# Altium schematic symbol library jlcpcb_2025_04_capacitors_extended_1206.schlib: 2503 symbols (part 5 of 14) (continued)
## C1206X222K201T
designator C?  Capacitance: 2.2nF  (hidden comment: *)
Capacitor, Ceramic (MLCC), 2.2nF, ±10%, 200V, X7R, ±10%, SMD 1206; Manufacturer: IHHEC(HOLY STONE ENTERPRISE CO., LTD); Manufacturer Part Number: C1206X222K201T; Package Size: 1206; JLCPCB Basic Part: No; JLCPCB Part Number: C106039; Supplier 1: LCSC; Category: Capacitors - MLCC; Supplier Part Number 1: C106039; Tolerance: ±10%; Voltage Rating: 200V; Temperature Coefficient: X7R; RoHS: Yes; ComponentLink1Description: Datasheet; ComponentLink1URL: https://wmsc.lcsc.com/wmsc/upload/file/pdf/v2/lcsc/2304140030_IHHEC-HOLY-STONE-ENTERPRISE-CO---LTD-C1206X222K201T_C106039.pdf; ComponentLink2Description: JLCPCB Part URL; ComponentLink2URL: https://jlcpcb.com/partdetail/C106039; ComponentLink3Description: LCSC Part URL; ComponentLink3URL: https://lcsc.com/product-detail/Multilayer-Ceramic-Capacitors-MLCC---SMD-SMT_IHHECHOLY-STONE-ENTERPRISE-CO.%2C-LTD-IHHECHOLY-STONE-ENTERPRISE-CO.%2C-LTD-C1206X222K201T_C106039.html
footprint CAP-1206 (1206 (3216M) Capacitor)
pins: 1, 2

## C1206X222K202T
designator C?  Capacitance: 2.2nF  (hidden comment: *)
Capacitor, Ceramic (MLCC), 2.2nF, ±10%, 2kV, X7R, ±10%, SMD 1206; Manufacturer: IHHEC(HOLY STONE ENTERPRISE CO., LTD); Manufacturer Part Number: C1206X222K202T; Package Size: 1206; JLCPCB Basic Part: No; JLCPCB Part Number: C106040; Supplier 1: LCSC; Category: Capacitors - MLCC; Supplier Part Number 1: C106040; Tolerance: ±10%; Voltage Rating: 2kV; Temperature Coefficient: X7R; RoHS: Yes; ComponentLink1Description: Datasheet; ComponentLink1URL: https://wmsc.lcsc.com/wmsc/upload/file/pdf/v2/lcsc/2304140030_IHHEC-HOLY-STONE-ENTERPRISE-CO---LTD-C1206X222K202T_C106040.pdf; ComponentLink2Description: JLCPCB Part URL; ComponentLink2URL: https://jlcpcb.com/partdetail/C106040; ComponentLink3Description: LCSC Part URL; ComponentLink3URL: https://lcsc.com/product-detail/Multilayer-Ceramic-Capacitors-MLCC---SMD-SMT_IHHECHOLY-STONE-ENTERPRISE-CO.%2C-LTD-IHHECHOLY-STONE-ENTERPRISE-CO.%2C-LTD-C1206X222K202T_C106040.html
footprint CAP-1206 (1206 (3216M) Capacitor)
pins: 1, 2

## C1206X222K251T
designator C?  Capacitance: 2.2nF  (hidden comment: *)
Capacitor, Ceramic (MLCC), 2.2nF, ±10%, 250V, X7R, ±10%, SMD 1206; Manufacturer: IHHEC(HOLY STONE ENTERPRISE CO., LTD); Manufacturer Part Number: C1206X222K251T; Package Size: 1206; JLCPCB Basic Part: No; JLCPCB Part Number: C106041; Supplier 1: LCSC; Category: Capacitors - MLCC; Supplier Part Number 1: C106041; Tolerance: ±10%; Voltage Rating: 250V; Temperature Coefficient: X7R; RoHS: Yes; ComponentLink1Description: Datasheet; ComponentLink1URL: https://wmsc.lcsc.com/wmsc/upload/file/pdf/v2/lcsc/2304140030_IHHEC-HOLY-STONE-ENTERPRISE-CO---LTD-C1206X222K251T_C106041.pdf; ComponentLink2Description: JLCPCB Part URL; ComponentLink2URL: https://jlcpcb.com/partdetail/C106041; ComponentLink3Description: LCSC Part URL; ComponentLink3URL: https://lcsc.com/product-detail/Multilayer-Ceramic-Capacitors-MLCC---SMD-SMT_IHHECHOLY-STONE-ENTERPRISE-CO.%2C-LTD-IHHECHOLY-STONE-ENTERPRISE-CO.%2C-LTD-C1206X222K251T_C106041.html
footprint CAP-1206 (1206 (3216M) Capacitor)
pins: 1, 2

## C1206X222K501T
designator C?  Capacitance: 2.2nF  (hidden comment: *)
Capacitor, Ceramic (MLCC), 2.2nF, ±10%, 500V, X7R, ±10%, SMD 1206; Manufacturer: IHHEC(HOLY STONE ENTERPRISE CO., LTD); Manufacturer Part Number: C1206X222K501T; Package Size: 1206; JLCPCB Basic Part: No; JLCPCB Part Number: C106042; Supplier 1: LCSC; Category: Capacitors - MLCC; Supplier Part Number 1: C106042; Tolerance: ±10%; Voltage Rating: 500V; Temperature Coefficient: X7R; RoHS: Yes; ComponentLink1Description: Datasheet; ComponentLink1URL: https://wmsc.lcsc.com/wmsc/upload/file/pdf/v2/lcsc/2304140030_IHHEC-HOLY-STONE-ENTERPRISE-CO---LTD-C1206X222K501T_C106042.pdf; ComponentLink2Description: JLCPCB Part URL; ComponentLink2URL: https://jlcpcb.com/partdetail/C106042; ComponentLink3Description: LCSC Part URL; ComponentLink3URL: https://lcsc.com/product-detail/Multilayer-Ceramic-Capacitors-MLCC---SMD-SMT_IHHECHOLY-STONE-ENTERPRISE-CO.%2C-LTD-IHHECHOLY-STONE-ENTERPRISE-CO.%2C-LTD-C1206X222K501T_C106042.html
footprint CAP-1206 (1206 (3216M) Capacitor)
pins: 1, 2

## C1206X223K101T
designator C?  Capacitance: 22nF  (hidden comment: *)
Capacitor, Ceramic (MLCC), 22nF, ±10%, 100V, X7R, ±10%, SMD 1206; Manufacturer: IHHEC(HOLY STONE ENTERPRISE CO., LTD); Manufacturer Part Number: C1206X223K101T; Package Size: 1206; JLCPCB Basic Part: No; JLCPCB Part Number: C106043; Supplier 1: LCSC; Category: Capacitors - MLCC; Supplier Part Number 1: C106043; Tolerance: ±10%; Voltage Rating: 100V; Temperature Coefficient: X7R; RoHS: Yes; ComponentLink1Description: Datasheet; ComponentLink1URL: https://wmsc.lcsc.com/wmsc/upload/file/pdf/v2/lcsc/2304140030_IHHEC-HOLY-STONE-ENTERPRISE-CO---LTD-C1206X223K101T_C106043.pdf; ComponentLink2Description: JLCPCB Part URL; ComponentLink2URL: https://jlcpcb.com/partdetail/C106043; ComponentLink3Description: LCSC Part URL; ComponentLink3URL: https://lcsc.com/product-detail/Multilayer-Ceramic-Capacitors-MLCC---SMD-SMT_IHHECHOLY-STONE-ENTERPRISE-CO.%2C-LTD-IHHECHOLY-STONE-ENTERPRISE-CO.%2C-LTD-C1206X223K101T_C106043.html
footprint CAP-1206 (1206 (3216M) Capacitor)
pins: 1, 2

## C1206X223K251T
designator C?  Capacitance: 22nF  (hidden comment: *)
Capacitor, Ceramic (MLCC), 22nF, ±10%, 250V, X7R, ±10%, SMD 1206; Manufacturer: IHHEC(HOLY STONE ENTERPRISE CO., LTD); Manufacturer Part Number: C1206X223K251T; Package Size: 1206; JLCPCB Basic Part: No; JLCPCB Part Number: C106044; Supplier 1: LCSC; Category: Capacitors - MLCC; Supplier Part Number 1: C106044; Tolerance: ±10%; Voltage Rating: 250V; Temperature Coefficient: X7R; RoHS: Yes; ComponentLink1Description: Datasheet; ComponentLink1URL: https://wmsc.lcsc.com/wmsc/upload/file/pdf/v2/lcsc/2304140030_IHHEC-HOLY-STONE-ENTERPRISE-CO---LTD-C1206X223K251T_C106044.pdf; ComponentLink2Description: JLCPCB Part URL; ComponentLink2URL: https://jlcpcb.com/partdetail/C106044; ComponentLink3Description: LCSC Part URL; ComponentLink3URL: https://lcsc.com/product-detail/Multilayer-Ceramic-Capacitors-MLCC---SMD-SMT_IHHECHOLY-STONE-ENTERPRISE-CO.%2C-LTD-IHHECHOLY-STONE-ENTERPRISE-CO.%2C-LTD-C1206X223K251T_C106044.html
footprint CAP-1206 (1206 (3216M) Capacitor)
pins: 1, 2

## C1206X224K201T_C106048
designator C?  Capacitance: 220nF  (hidden comment: *)
Capacitor, Ceramic (MLCC), 220nF, ±10%, 200V, X7R, ±10%, SMD 1206; Manufacturer: IHHEC(HOLY STONE ENTERPRISE CO., LTD); Manufacturer Part Number: C1206X224K201T; Package Size: 1206; JLCPCB Basic Part: No; JLCPCB Part Number: C106048; Supplier 1: LCSC; Category: Capacitors - MLCC; Supplier Part Number 1: C106048; Tolerance: ±10%; Voltage Rating: 200V; Temperature Coefficient: X7R; RoHS: Yes; ComponentLink1Description: Datasheet; ComponentLink1URL: https://wmsc.lcsc.com/wmsc/upload/file/pdf/v2/lcsc/2304140030_IHHEC-HOLY-STONE-ENTERPRISE-CO---LTD-C1206X224K201T_C106048.pdf; ComponentLink2Description: JLCPCB Part URL; ComponentLink2URL: https://jlcpcb.com/partdetail/C106048; ComponentLink3Description: LCSC Part URL; ComponentLink3URL: https://lcsc.com/product-detail/Multilayer-Ceramic-Capacitors-MLCC---SMD-SMT_IHHECHOLY-STONE-ENTERPRISE-CO.%2C-LTD-IHHECHOLY-STONE-ENTERPRISE-CO.%2C-LTD-C1206X224K201T_C106048.html
footprint CAP-1206 (1206 (3216M) Capacitor)
pins: 1, 2

## C1206X224K201T_C330057
designator C?  Capacitance: 220nF  (hidden comment: *)
Capacitor, Ceramic (MLCC), 220nF, ±10%, 200V, X7R, ±10%, SMD 1206; Manufacturer: IHHEC(HOLY STONE ENTERPRISE CO., LTD); Manufacturer Part Number: C1206X224K201T; Package Size: 1206; JLCPCB Basic Part: No; JLCPCB Part Number: C330057; Supplier 1: LCSC; Category: Capacitors - MLCC; Supplier Part Number 1: C330057; Tolerance: ±10%; Voltage Rating: 200V; Temperature Coefficient: X7R; RoHS: Yes; ComponentLink1Description: Datasheet; ComponentLink1URL: https://wmsc.lcsc.com/wmsc/upload/file/pdf/v2/lcsc/2304140030_IHHEC-HOLY-STONE-ENTERPRISE-CO---LTD-C1206X224K201T_C330057.pdf; ComponentLink2Description: JLCPCB Part URL; ComponentLink2URL: https://jlcpcb.com/partdetail/C330057; ComponentLink3Description: LCSC Part URL; ComponentLink3URL: https://lcsc.com/product-detail/Multilayer-Ceramic-Capacitors-MLCC---SMD-SMT_IHHECHOLY-STONE-ENTERPRISE-CO.%2C-LTD-IHHECHOLY-STONE-ENTERPRISE-CO.%2C-LTD-C1206X224K201T_C330057.html
footprint CAP-1206 (1206 (3216M) Capacitor)
pins: 1, 2

## C1206X224K251T
designator C?  Capacitance: 220nF  (hidden comment: *)
Capacitor, Ceramic (MLCC), 220nF, ±10%, 250V, X7R, ±10%, SMD 1206; Manufacturer: IHHEC(HOLY STONE ENTERPRISE CO., LTD); Manufacturer Part Number: C1206X224K251T; Package Size: 1206; JLCPCB Basic Part: No; JLCPCB Part Number: C106049; Supplier 1: LCSC; Category: Capacitors - MLCC; Supplier Part Number 1: C106049; Tolerance: ±10%; Voltage Rating: 250V; Temperature Coefficient: X7R; RoHS: Yes; ComponentLink1Description: Datasheet; ComponentLink1URL: https://wmsc.lcsc.com/wmsc/upload/file/pdf/v2/lcsc/2304140030_IHHEC-HOLY-STONE-ENTERPRISE-CO---LTD-C1206X224K251T_C106049.pdf; ComponentLink2Description: JLCPCB Part URL; ComponentLink2URL: https://jlcpcb.com/partdetail/C106049; ComponentLink3Description: LCSC Part URL; ComponentLink3URL: https://lcsc.com/product-detail/Multilayer-Ceramic-Capacitors-MLCC---SMD-SMT_IHHECHOLY-STONE-ENTERPRISE-CO.%2C-LTD-IHHECHOLY-STONE-ENTERPRISE-CO.%2C-LTD-C1206X224K251T_C106049.html
footprint CAP-1206 (1206 (3216M) Capacitor)
pins: 1, 2

## C1206X225K101T
designator C?  Capacitance: 2.2uF  (hidden comment: *)
Capacitor, Ceramic (MLCC), 2.2uF, ±10%, 100V, X7R, ±10%, SMD 1206; Manufacturer: IHHEC(HOLY STONE ENTERPRISE CO., LTD); Manufacturer Part Number: C1206X225K101T; Package Size: 1206; JLCPCB Basic Part: No; JLCPCB Part Number: C106051; Supplier 1: LCSC; Category: Capacitors - MLCC; Supplier Part Number 1: C106051; Tolerance: ±10%; Voltage Rating: 100V; Temperature Coefficient: X7R; RoHS: Yes; ComponentLink1Description: Datasheet; ComponentLink1URL: https://wmsc.lcsc.com/wmsc/upload/file/pdf/v2/lcsc/2304140030_IHHEC-HOLY-STONE-ENTERPRISE-CO---LTD-C1206X225K101T_C106051.pdf; ComponentLink2Description: JLCPCB Part URL; ComponentLink2URL: https://jlcpcb.com/partdetail/C106051; ComponentLink3Description: LCSC Part URL; ComponentLink3URL: https://lcsc.com/product-detail/Multilayer-Ceramic-Capacitors-MLCC---SMD-SMT_IHHECHOLY-STONE-ENTERPRISE-CO.%2C-LTD-IHHECHOLY-STONE-ENTERPRISE-CO.%2C-LTD-C1206X225K101T_C106051.html
footprint CAP-1206 (1206 (3216M) Capacitor)
pins: 1, 2

## C1206X225K101TE30
designator C?  Capacitance: 2.2uF  (hidden comment: *)
Capacitor, Ceramic (MLCC), 2.2uF, ±10%, 100V, X7R, ±10%, SMD 1206; Manufacturer: IHHEC(HOLY STONE ENTERPRISE CO., LTD); Manufacturer Part Number: C1206X225K101TE30; Package Size: 1206; JLCPCB Basic Part: No; JLCPCB Part Number: C2922468; Supplier 1: LCSC; Category: Capacitors - MLCC; Supplier Part Number 1: C2922468; Tolerance: ±10%; Voltage Rating: 100V; Temperature Coefficient: X7R; RoHS: Yes; ComponentLink1Description: Datasheet; ComponentLink1URL: https://wmsc.lcsc.com/wmsc/upload/file/pdf/v2/lcsc/2111301030_IHHEC-HOLY-STONE-ENTERPRISE-CO---LTD-C1206X225K101TE30_C2922468.pdf; ComponentLink2Description: JLCPCB Part URL; ComponentLink2URL: https://jlcpcb.com/partdetail/C2922468; ComponentLink3Description: LCSC Part URL; ComponentLink3URL: https://lcsc.com/product-detail/Multilayer-Ceramic-Capacitors-MLCC---SMD-SMT_IHHECHOLY-STONE-ENTERPRISE-CO.%2C-LTD-IHHECHOLY-STONE-ENTERPRISE-CO.%2C-LTD-C1206X225K101TE30_C2922468.html
footprint CAP-1206 (1206 (3216M) Capacitor)
pins: 1, 2

## C1206X273K501T
designator C?  Capacitance: 27nF  (hidden comment: *)
Capacitor, Ceramic (MLCC), 27nF, ±10%, 500V, X7R, ±10%, SMD 1206; Manufacturer: IHHEC(HOLY STONE ENTERPRISE CO., LTD); Manufacturer Part Number: C1206X273K501T; Package Size: 1206; JLCPCB Basic Part: No; JLCPCB Part Number: C106053; Supplier 1: LCSC; Category: Capacitors - MLCC; Supplier Part Number 1: C106053; Tolerance: ±10%; Voltage Rating: 500V; Temperature Coefficient: X7R; RoHS: Yes; ComponentLink1Description: Datasheet; ComponentLink1URL: https://wmsc.lcsc.com/wmsc/upload/file/pdf/v2/lcsc/2304140030_IHHEC-HOLY-STONE-ENTERPRISE-CO---LTD-C1206X273K501T_C106053.pdf; ComponentLink2Description: JLCPCB Part URL; ComponentLink2URL: https://jlcpcb.com/partdetail/C106053; ComponentLink3Description: LCSC Part URL; ComponentLink3URL: https://lcsc.com/product-detail/Multilayer-Ceramic-Capacitors-MLCC---SMD-SMT_IHHECHOLY-STONE-ENTERPRISE-CO.%2C-LTD-IHHECHOLY-STONE-ENTERPRISE-CO.%2C-LTD-C1206X273K501T_C106053.html
footprint CAP-1206 (1206 (3216M) Capacitor)
pins: 1, 2

## C1206X273K631T
designator C?  Capacitance: 27nF  (hidden comment: *)
Capacitor, Ceramic (MLCC), 27nF, ±10%, 630V, X7R, ±10%, SMD 1206; Manufacturer: IHHEC(HOLY STONE ENTERPRISE CO., LTD); Manufacturer Part Number: C1206X273K631T; Package Size: 1206; JLCPCB Basic Part: No; JLCPCB Part Number: C106054; Supplier 1: LCSC; Category: Capacitors - MLCC; Supplier Part Number 1: C106054; Tolerance: ±10%; Voltage Rating: 630V; Temperature Coefficient: X7R; RoHS: Yes; ComponentLink1Description: Datasheet; ComponentLink1URL: https://wmsc.lcsc.com/wmsc/upload/file/pdf/v2/lcsc/2304140030_IHHEC-HOLY-STONE-ENTERPRISE-CO---LTD-C1206X273K631T_C106054.pdf; ComponentLink2Description: JLCPCB Part URL; ComponentLink2URL: https://jlcpcb.com/partdetail/C106054; ComponentLink3Description: LCSC Part URL; ComponentLink3URL: https://lcsc.com/product-detail/Multilayer-Ceramic-Capacitors-MLCC---SMD-SMT_IHHECHOLY-STONE-ENTERPRISE-CO.%2C-LTD-IHHECHOLY-STONE-ENTERPRISE-CO.%2C-LTD-C1206X273K631T_C106054.html
footprint CAP-1206 (1206 (3216M) Capacitor)
pins: 1, 2

## C1206X331K101T
designator C?  Capacitance: 330pF  (hidden comment: *)
Capacitor, Ceramic (MLCC), 330pF, ±10%, 100V, X7R, ±10%, SMD 1206; Manufacturer: IHHEC(HOLY STONE ENTERPRISE CO., LTD); Manufacturer Part Number: C1206X331K101T; Package Size: 1206; JLCPCB Basic Part: No; JLCPCB Part Number: C106055; Supplier 1: LCSC; Category: Capacitors - MLCC; Supplier Part Number 1: C106055; Tolerance: ±10%; Voltage Rating: 100V; Temperature Coefficient: X7R; RoHS: Yes; ComponentLink1Description: Datasheet; ComponentLink1URL: https://wmsc.lcsc.com/wmsc/upload/file/pdf/v2/lcsc/2304140030_IHHEC-HOLY-STONE-ENTERPRISE-CO---LTD-C1206X331K101T_C106055.pdf; ComponentLink2Description: JLCPCB Part URL; ComponentLink2URL: https://jlcpcb.com/partdetail/C106055; ComponentLink3Description: LCSC Part URL; ComponentLink3URL: https://lcsc.com/product-detail/Multilayer-Ceramic-Capacitors-MLCC---SMD-SMT_IHHECHOLY-STONE-ENTERPRISE-CO.%2C-LTD-IHHECHOLY-STONE-ENTERPRISE-CO.%2C-LTD-C1206X331K101T_C106055.html
footprint CAP-1206 (1206 (3216M) Capacitor)
pins: 1, 2

## C1206X331K102T
designator C?  Capacitance: 330pF  (hidden comment: *)
Capacitor, Ceramic (MLCC), 330pF, ±10%, 1kV, X7R, ±10%, SMD 1206; Manufacturer: IHHEC(HOLY STONE ENTERPRISE CO., LTD); Manufacturer Part Number: C1206X331K102T; Package Size: 1206; JLCPCB Basic Part: No; JLCPCB Part Number: C106056; Supplier 1: LCSC; Category: Capacitors - MLCC; Supplier Part Number 1: C106056; Tolerance: ±10%; Voltage Rating: 1kV; Temperature Coefficient: X7R; RoHS: Yes; ComponentLink1Description: Datasheet; ComponentLink1URL: https://wmsc.lcsc.com/wmsc/upload/file/pdf/v2/lcsc/2304140030_IHHEC-HOLY-STONE-ENTERPRISE-CO---LTD-C1206X331K102T_C106056.pdf; ComponentLink2Description: JLCPCB Part URL; ComponentLink2URL: https://jlcpcb.com/partdetail/C106056; ComponentLink3Description: LCSC Part URL; ComponentLink3URL: https://lcsc.com/product-detail/Multilayer-Ceramic-Capacitors-MLCC---SMD-SMT_IHHECHOLY-STONE-ENTERPRISE-CO.%2C-LTD-IHHECHOLY-STONE-ENTERPRISE-CO.%2C-LTD-C1206X331K102T_C106056.html
footprint CAP-1206 (1206 (3216M) Capacitor)
pins: 1, 2

## C1206X331K201T
designator C?  Capacitance: 330pF  (hidden comment: *)
Capacitor, Ceramic (MLCC), 330pF, ±10%, 200V, X7R, ±10%, SMD 1206; Manufacturer: IHHEC(HOLY STONE ENTERPRISE CO., LTD); Manufacturer Part Number: C1206X331K201T; Package Size: 1206; JLCPCB Basic Part: No; JLCPCB Part Number: C106057; Supplier 1: LCSC; Category: Capacitors - MLCC; Supplier Part Number 1: C106057; Tolerance: ±10%; Voltage Rating: 200V; Temperature Coefficient: X7R; RoHS: Yes; ComponentLink1Description: Datasheet; ComponentLink1URL: https://wmsc.lcsc.com/wmsc/upload/file/pdf/v2/lcsc/2304140030_IHHEC-HOLY-STONE-ENTERPRISE-CO---LTD-C1206X331K201T_C106057.pdf; ComponentLink2Description: JLCPCB Part URL; ComponentLink2URL: https://jlcpcb.com/partdetail/C106057; ComponentLink3Description: LCSC Part URL; ComponentLink3URL: https://lcsc.com/product-detail/Multilayer-Ceramic-Capacitors-MLCC---SMD-SMT_IHHECHOLY-STONE-ENTERPRISE-CO.%2C-LTD-IHHECHOLY-STONE-ENTERPRISE-CO.%2C-LTD-C1206X331K201T_C106057.html
footprint CAP-1206 (1206 (3216M) Capacitor)
pins: 1, 2

## C1206X331K251T
designator C?  Capacitance: 330pF  (hidden comment: *)
Capacitor, Ceramic (MLCC), 330pF, ±10%, 250V, X7R, ±10%, SMD 1206; Manufacturer: IHHEC(HOLY STONE ENTERPRISE CO., LTD); Manufacturer Part Number: C1206X331K251T; Package Size: 1206; JLCPCB Basic Part: No; JLCPCB Part Number: C961525; Supplier 1: LCSC; Category: Capacitors - MLCC; Supplier Part Number 1: C961525; Tolerance: ±10%; Voltage Rating: 250V; Temperature Coefficient: X7R; RoHS: Yes; ComponentLink1Description: Datasheet; ComponentLink1URL: https://wmsc.lcsc.com/wmsc/upload/file/pdf/v2/lcsc/2304140030_IHHEC-HOLY-STONE-ENTERPRISE-CO---LTD-C1206X331K251T_C961525.pdf; ComponentLink2Description: JLCPCB Part URL; ComponentLink2URL: https://jlcpcb.com/partdetail/C961525; ComponentLink3Description: LCSC Part URL; ComponentLink3URL: https://lcsc.com/product-detail/Multilayer-Ceramic-Capacitors-MLCC---SMD-SMT_IHHECHOLY-STONE-ENTERPRISE-CO.%2C-LTD-IHHECHOLY-STONE-ENTERPRISE-CO.%2C-LTD-C1206X331K251T_C961525.html
footprint CAP-1206 (1206 (3216M) Capacitor)
pins: 1, 2

## C1206X331K501T
designator C?  Capacitance: 330pF  (hidden comment: *)
Capacitor, Ceramic (MLCC), 330pF, ±10%, 500V, X7R, ±10%, SMD 1206; Manufacturer: IHHEC(HOLY STONE ENTERPRISE CO., LTD); Manufacturer Part Number: C1206X331K501T; Package Size: 1206; JLCPCB Basic Part: No; JLCPCB Part Number: C106058; Supplier 1: LCSC; Category: Capacitors - MLCC; Supplier Part Number 1: C106058; Tolerance: ±10%; Voltage Rating: 500V; Temperature Coefficient: X7R; RoHS: Yes; ComponentLink1Description: Datasheet; ComponentLink1URL: https://wmsc.lcsc.com/wmsc/upload/file/pdf/v2/lcsc/2304140030_IHHEC-HOLY-STONE-ENTERPRISE-CO---LTD-C1206X331K501T_C106058.pdf; ComponentLink2Description: JLCPCB Part URL; ComponentLink2URL: https://jlcpcb.com/partdetail/C106058; ComponentLink3Description: LCSC Part URL; ComponentLink3URL: https://lcsc.com/product-detail/Multilayer-Ceramic-Capacitors-MLCC---SMD-SMT_IHHECHOLY-STONE-ENTERPRISE-CO.%2C-LTD-IHHECHOLY-STONE-ENTERPRISE-CO.%2C-LTD-C1206X331K501T_C106058.html
footprint CAP-1206 (1206 (3216M) Capacitor)
pins: 1, 2

## C1206X331K631T
designator C?  Capacitance: 330pF  (hidden comment: *)
Capacitor, Ceramic (MLCC), 330pF, ±10%, 630V, X7R, ±10%, SMD 1206; Manufacturer: IHHEC(HOLY STONE ENTERPRISE CO., LTD); Manufacturer Part Number: C1206X331K631T; Package Size: 1206; JLCPCB Basic Part: No; JLCPCB Part Number: C337977; Supplier 1: LCSC; Category: Capacitors - MLCC; Supplier Part Number 1: C337977; Tolerance: ±10%; Voltage Rating: 630V; Temperature Coefficient: X7R; RoHS: Yes; ComponentLink1Description: Datasheet; ComponentLink1URL: https://wmsc.lcsc.com/wmsc/upload/file/pdf/v2/lcsc/2304140030_IHHEC-HOLY-STONE-ENTERPRISE-CO---LTD-C1206X331K631T_C337977.pdf; ComponentLink2Description: JLCPCB Part URL; ComponentLink2URL: https://jlcpcb.com/partdetail/C337977; ComponentLink3Description: LCSC Part URL; ComponentLink3URL: https://lcsc.com/product-detail/Multilayer-Ceramic-Capacitors-MLCC---SMD-SMT_IHHECHOLY-STONE-ENTERPRISE-CO.%2C-LTD-IHHECHOLY-STONE-ENTERPRISE-CO.%2C-LTD-C1206X331K631T_C337977.html
footprint CAP-1206 (1206 (3216M) Capacitor)
pins: 1, 2

## C1206X332K101T
designator C?  Capacitance: 3.3nF  (hidden comment: *)
Capacitor, Ceramic (MLCC), 3.3nF, ±10%, 100V, X7R, ±10%, SMD 1206; Manufacturer: IHHEC(HOLY STONE ENTERPRISE CO., LTD); Manufacturer Part Number: C1206X332K101T; Package Size: 1206; JLCPCB Basic Part: No; JLCPCB Part Number: C106059; Supplier 1: LCSC; Category: Capacitors - MLCC; Supplier Part Number 1: C106059; Tolerance: ±10%; Voltage Rating: 100V; Temperature Coefficient: X7R; RoHS: Yes; ComponentLink1Description: Datasheet; ComponentLink1URL: https://wmsc.lcsc.com/wmsc/upload/file/pdf/v2/lcsc/2304140030_IHHEC-HOLY-STONE-ENTERPRISE-CO---LTD-C1206X332K101T_C106059.pdf; ComponentLink2Description: JLCPCB Part URL; ComponentLink2URL: https://jlcpcb.com/partdetail/C106059; ComponentLink3Description: LCSC Part URL; ComponentLink3URL: https://lcsc.com/product-detail/Multilayer-Ceramic-Capacitors-MLCC---SMD-SMT_IHHECHOLY-STONE-ENTERPRISE-CO.%2C-LTD-IHHECHOLY-STONE-ENTERPRISE-CO.%2C-LTD-C1206X332K101T_C106059.html
footprint CAP-1206 (1206 (3216M) Capacitor)
pins: 1, 2

## C1206X332K102T
designator C?  Capacitance: 3.3nF  (hidden comment: *)
Capacitor, Ceramic (MLCC), 3.3nF, ±10%, 1kV, X7R, ±10%, SMD 1206; Manufacturer: IHHEC(HOLY STONE ENTERPRISE CO., LTD); Manufacturer Part Number: C1206X332K102T; Package Size: 1206; JLCPCB Basic Part: No; JLCPCB Part Number: C106060; Supplier 1: LCSC; Category: Capacitors - MLCC; Supplier Part Number 1: C106060; Tolerance: ±10%; Voltage Rating: 1kV; Temperature Coefficient: X7R; RoHS: Yes; ComponentLink1Description: Datasheet; ComponentLink1URL: https://wmsc.lcsc.com/wmsc/upload/file/pdf/v2/lcsc/2304140030_IHHEC-HOLY-STONE-ENTERPRISE-CO---LTD-C1206X332K102T_C106060.pdf; ComponentLink2Description: JLCPCB Part URL; ComponentLink2URL: https://jlcpcb.com/partdetail/C106060; ComponentLink3Description: LCSC Part URL; ComponentLink3URL: https://lcsc.com/product-detail/Multilayer-Ceramic-Capacitors-MLCC---SMD-SMT_IHHECHOLY-STONE-ENTERPRISE-CO.%2C-LTD-IHHECHOLY-STONE-ENTERPRISE-CO.%2C-LTD-C1206X332K102T_C106060.html
footprint CAP-1206 (1206 (3216M) Capacitor)
pins: 1, 2

## C1206X332K501T
designator C?  Capacitance: 3.3nF  (hidden comment: *)
Capacitor, Ceramic (MLCC), 3.3nF, ±10%, 500V, X7R, ±10%, SMD 1206; Manufacturer: IHHEC(HOLY STONE ENTERPRISE CO., LTD); Manufacturer Part Number: C1206X332K501T; Package Size: 1206; JLCPCB Basic Part: No; JLCPCB Part Number: C106062; Supplier 1: LCSC; Category: Capacitors - MLCC; Supplier Part Number 1: C106062; Tolerance: ±10%; Voltage Rating: 500V; Temperature Coefficient: X7R; RoHS: Yes; ComponentLink1Description: Datasheet; ComponentLink1URL: https://wmsc.lcsc.com/wmsc/upload/file/pdf/v2/lcsc/2304140030_IHHEC-HOLY-STONE-ENTERPRISE-CO---LTD-C1206X332K501T_C106062.pdf; ComponentLink2Description: JLCPCB Part URL; ComponentLink2URL: https://jlcpcb.com/partdetail/C106062; ComponentLink3Description: LCSC Part URL; ComponentLink3URL: https://lcsc.com/product-detail/Multilayer-Ceramic-Capacitors-MLCC---SMD-SMT_IHHECHOLY-STONE-ENTERPRISE-CO.%2C-LTD-IHHECHOLY-STONE-ENTERPRISE-CO.%2C-LTD-C1206X332K501T_C106062.html
footprint CAP-1206 (1206 (3216M) Capacitor)
pins: 1, 2

## C1206X333K251T
designator C?  Capacitance: 33nF  (hidden comment: *)
Capacitor, Ceramic (MLCC), 33nF, ±10%, 250V, X7R, ±10%, SMD 1206; Manufacturer: IHHEC(HOLY STONE ENTERPRISE CO., LTD); Manufacturer Part Number: C1206X333K251T; Package Size: 1206; JLCPCB Basic Part: No; JLCPCB Part Number: C106063; Supplier 1: LCSC; Category: Capacitors - MLCC; Supplier Part Number 1: C106063; Tolerance: ±10%; Voltage Rating: 250V; Temperature Coefficient: X7R; RoHS: Yes; ComponentLink1Description: Datasheet; ComponentLink1URL: https://wmsc.lcsc.com/wmsc/upload/file/pdf/v2/lcsc/2304140030_IHHEC-HOLY-STONE-ENTERPRISE-CO---LTD-C1206X333K251T_C106063.pdf; ComponentLink2Description: JLCPCB Part URL; ComponentLink2URL: https://jlcpcb.com/partdetail/C106063; ComponentLink3Description: LCSC Part URL; ComponentLink3URL: https://lcsc.com/product-detail/Multilayer-Ceramic-Capacitors-MLCC---SMD-SMT_IHHECHOLY-STONE-ENTERPRISE-CO.%2C-LTD-IHHECHOLY-STONE-ENTERPRISE-CO.%2C-LTD-C1206X333K251T_C106063.html
footprint CAP-1206 (1206 (3216M) Capacitor)
pins: 1, 2

## C1206X333K501T
designator C?  Capacitance: 33nF  (hidden comment: *)
Capacitor, Ceramic (MLCC), 33nF, ±10%, 500V, X7R, ±10%, SMD 1206; Manufacturer: IHHEC(HOLY STONE ENTERPRISE CO., LTD); Manufacturer Part Number: C1206X333K501T; Package Size: 1206; JLCPCB Basic Part: No; JLCPCB Part Number: C106064; Supplier 1: LCSC; Category: Capacitors - MLCC; Supplier Part Number 1: C106064; Tolerance: ±10%; Voltage Rating: 500V; Temperature Coefficient: X7R; RoHS: Yes; ComponentLink1Description: Datasheet; ComponentLink1URL: https://wmsc.lcsc.com/wmsc/upload/file/pdf/v2/lcsc/2304140030_IHHEC-HOLY-STONE-ENTERPRISE-CO---LTD-C1206X333K501T_C106064.pdf; ComponentLink2Description: JLCPCB Part URL; ComponentLink2URL: https://jlcpcb.com/partdetail/C106064; ComponentLink3Description: LCSC Part URL; ComponentLink3URL: https://lcsc.com/product-detail/Multilayer-Ceramic-Capacitors-MLCC---SMD-SMT_IHHECHOLY-STONE-ENTERPRISE-CO.%2C-LTD-IHHECHOLY-STONE-ENTERPRISE-CO.%2C-LTD-C1206X333K501T_C106064.html
footprint CAP-1206 (1206 (3216M) Capacitor)
pins: 1, 2

## C1206X333K631T
designator C?  Capacitance: 33nF  (hidden comment: *)
Capacitor, Ceramic (MLCC), 33nF, ±10%, 630V, X7R, ±10%, SMD 1206; Manufacturer: IHHEC(HOLY STONE ENTERPRISE CO., LTD); Manufacturer Part Number: C1206X333K631T; Package Size: 1206; JLCPCB Basic Part: No; JLCPCB Part Number: C106065; Supplier 1: LCSC; Category: Capacitors - MLCC; Supplier Part Number 1: C106065; Tolerance: ±10%; Voltage Rating: 630V; Temperature Coefficient: X7R; RoHS: Yes; ComponentLink1Description: Datasheet; ComponentLink1URL: https://wmsc.lcsc.com/wmsc/upload/file/pdf/v2/lcsc/2304140030_IHHEC-HOLY-STONE-ENTERPRISE-CO---LTD-C1206X333K631T_C106065.pdf; ComponentLink2Description: JLCPCB Part URL; ComponentLink2URL: https://jlcpcb.com/partdetail/C106065; ComponentLink3Description: LCSC Part URL; ComponentLink3URL: https://lcsc.com/product-detail/Multilayer-Ceramic-Capacitors-MLCC---SMD-SMT_IHHECHOLY-STONE-ENTERPRISE-CO.%2C-LTD-IHHECHOLY-STONE-ENTERPRISE-CO.%2C-LTD-C1206X333K631T_C106065.html
footprint CAP-1206 (1206 (3216M) Capacitor)
pins: 1, 2

## C1206X471K102T
designator C?  Capacitance: 470pF  (hidden comment: *)
Capacitor, Ceramic (MLCC), 470pF, ±10%, 1kV, X7R, ±10%, SMD 1206; Manufacturer: IHHEC(HOLY STONE ENTERPRISE CO., LTD); Manufacturer Part Number: C1206X471K102T; Package Size: 1206; JLCPCB Basic Part: No; JLCPCB Part Number: C106068; Supplier 1: LCSC; Category: Capacitors - MLCC; Supplier Part Number 1: C106068; Tolerance: ±10%; Voltage Rating: 1kV; Temperature Coefficient: X7R; RoHS: Yes; ComponentLink1Description: Datasheet; ComponentLink1URL: https://wmsc.lcsc.com/wmsc/upload/file/pdf/v2/lcsc/2304140030_IHHEC-HOLY-STONE-ENTERPRISE-CO---LTD-C1206X471K102T_C106068.pdf; ComponentLink2Description: JLCPCB Part URL; ComponentLink2URL: https://jlcpcb.com/partdetail/C106068; ComponentLink3Description: LCSC Part URL; ComponentLink3URL: https://lcsc.com/product-detail/Multilayer-Ceramic-Capacitors-MLCC---SMD-SMT_IHHECHOLY-STONE-ENTERPRISE-CO.%2C-LTD-IHHECHOLY-STONE-ENTERPRISE-CO.%2C-LTD-C1206X471K102T_C106068.html
footprint CAP-1206 (1206 (3216M) Capacitor)
pins: 1, 2

## C1206X471K202T
designator C?  Capacitance: 470pF  (hidden comment: *)
Capacitor, Ceramic (MLCC), 470pF, ±10%, 2kV, X7R, ±10%, SMD 1206; Manufacturer: IHHEC(HOLY STONE ENTERPRISE CO., LTD); Manufacturer Part Number: C1206X471K202T; Package Size: 1206; JLCPCB Basic Part: No; JLCPCB Part Number: C106070; Supplier 1: LCSC; Category: Capacitors - MLCC; Supplier Part Number 1: C106070; Tolerance: ±10%; Voltage Rating: 2kV; Temperature Coefficient: X7R; RoHS: Yes; ComponentLink1Description: Datasheet; ComponentLink1URL: https://wmsc.lcsc.com/wmsc/upload/file/pdf/v2/lcsc/2304140030_IHHEC-HOLY-STONE-ENTERPRISE-CO---LTD-C1206X471K202T_C106070.pdf; ComponentLink2Description: JLCPCB Part URL; ComponentLink2URL: https://jlcpcb.com/partdetail/C106070; ComponentLink3Description: LCSC Part URL; ComponentLink3URL: https://lcsc.com/product-detail/Multilayer-Ceramic-Capacitors-MLCC---SMD-SMT_IHHECHOLY-STONE-ENTERPRISE-CO.%2C-LTD-IHHECHOLY-STONE-ENTERPRISE-CO.%2C-LTD-C1206X471K202T_C106070.html
footprint CAP-1206 (1206 (3216M) Capacitor)
pins: 1, 2

## C1206X471K251T
designator C?  Capacitance: 470pF  (hidden comment: *)
Capacitor, Ceramic (MLCC), 470pF, ±10%, 250V, X7R, ±10%, SMD 1206; Manufacturer: IHHEC(HOLY STONE ENTERPRISE CO., LTD); Manufacturer Part Number: C1206X471K251T; Package Size: 1206; JLCPCB Basic Part: No; JLCPCB Part Number: C106071; Supplier 1: LCSC; Category: Capacitors - MLCC; Supplier Part Number 1: C106071; Tolerance: ±10%; Voltage Rating: 250V; Temperature Coefficient: X7R; RoHS: Yes; ComponentLink1Description: Datasheet; ComponentLink1URL: https://wmsc.lcsc.com/wmsc/upload/file/pdf/v2/lcsc/2304140030_IHHEC-HOLY-STONE-ENTERPRISE-CO---LTD-C1206X471K251T_C106071.pdf; ComponentLink2Description: JLCPCB Part URL; ComponentLink2URL: https://jlcpcb.com/partdetail/C106071; ComponentLink3Description: LCSC Part URL; ComponentLink3URL: https://lcsc.com/product-detail/Multilayer-Ceramic-Capacitors-MLCC---SMD-SMT_IHHECHOLY-STONE-ENTERPRISE-CO.%2C-LTD-IHHECHOLY-STONE-ENTERPRISE-CO.%2C-LTD-C1206X471K251T_C106071.html
footprint CAP-1206 (1206 (3216M) Capacitor)
pins: 1, 2

## C1206X472K050T
designator C?  Capacitance: 4.7nF  (hidden comment: *)
Capacitor, Ceramic (MLCC), 4.7nF, ±10%, 50V, X7R, ±10%, SMD 1206; Manufacturer: IHHEC(HOLY STONE ENTERPRISE CO., LTD); Manufacturer Part Number: C1206X472K050T; Package Size: 1206; JLCPCB Basic Part: No; JLCPCB Part Number: C961528; Supplier 1: LCSC; Category: Capacitors - MLCC; Supplier Part Number 1: C961528; Tolerance: ±10%; Voltage Rating: 50V; Temperature Coefficient: X7R; RoHS: Yes; ComponentLink1Description: Datasheet; ComponentLink1URL: https://wmsc.lcsc.com/wmsc/upload/file/pdf/v2/lcsc/2304140030_IHHEC-HOLY-STONE-ENTERPRISE-CO---LTD-C1206X472K050T_C961528.pdf; ComponentLink2Description: JLCPCB Part URL; ComponentLink2URL: https://jlcpcb.com/partdetail/C961528; ComponentLink3Description: LCSC Part URL; ComponentLink3URL: https://lcsc.com/product-detail/Multilayer-Ceramic-Capacitors-MLCC---SMD-SMT_IHHECHOLY-STONE-ENTERPRISE-CO.%2C-LTD-IHHECHOLY-STONE-ENTERPRISE-CO.%2C-LTD-C1206X472K050T_C961528.html
footprint CAP-1206 (1206 (3216M) Capacitor)
pins: 1, 2

## C1206X472K101T
designator C?  Capacitance: 4.7nF  (hidden comment: *)
Capacitor, Ceramic (MLCC), 4.7nF, ±10%, 100V, X7R, ±10%, SMD 1206; Manufacturer: IHHEC(HOLY STONE ENTERPRISE CO., LTD); Manufacturer Part Number: C1206X472K101T; Package Size: 1206; JLCPCB Basic Part: No; JLCPCB Part Number: C106073; Supplier 1: LCSC; Category: Capacitors - MLCC; Supplier Part Number 1: C106073; Tolerance: ±10%; Voltage Rating: 100V; Temperature Coefficient: X7R; RoHS: Yes; ComponentLink1Description: Datasheet; ComponentLink1URL: https://wmsc.lcsc.com/wmsc/upload/file/pdf/v2/lcsc/2304140030_IHHEC-HOLY-STONE-ENTERPRISE-CO---LTD-C1206X472K101T_C106073.pdf; ComponentLink2Description: JLCPCB Part URL; ComponentLink2URL: https://jlcpcb.com/partdetail/C106073; ComponentLink3Description: LCSC Part URL; ComponentLink3URL: https://lcsc.com/product-detail/Multilayer-Ceramic-Capacitors-MLCC---SMD-SMT_IHHECHOLY-STONE-ENTERPRISE-CO.%2C-LTD-IHHECHOLY-STONE-ENTERPRISE-CO.%2C-LTD-C1206X472K101T_C106073.html
footprint CAP-1206 (1206 (3216M) Capacitor)
pins: 1, 2

## C1206X472K102T
designator C?  Capacitance: 4.7nF  (hidden comment: *)
Capacitor, Ceramic (MLCC), 4.7nF, ±10%, 1kV, X7R, ±10%, SMD 1206; Manufacturer: IHHEC(HOLY STONE ENTERPRISE CO., LTD); Manufacturer Part Number: C1206X472K102T; Package Size: 1206; JLCPCB Basic Part: No; JLCPCB Part Number: C106074; Supplier 1: LCSC; Category: Capacitors - MLCC; Supplier Part Number 1: C106074; Tolerance: ±10%; Voltage Rating: 1kV; Temperature Coefficient: X7R; RoHS: Yes; ComponentLink1Description: Datasheet; ComponentLink1URL: https://wmsc.lcsc.com/wmsc/upload/file/pdf/v2/lcsc/2304140030_IHHEC-HOLY-STONE-ENTERPRISE-CO---LTD-C1206X472K102T_C106074.pdf; ComponentLink2Description: JLCPCB Part URL; ComponentLink2URL: https://jlcpcb.com/partdetail/C106074; ComponentLink3Description: LCSC Part URL; ComponentLink3URL: https://lcsc.com/product-detail/Multilayer-Ceramic-Capacitors-MLCC---SMD-SMT_IHHECHOLY-STONE-ENTERPRISE-CO.%2C-LTD-IHHECHOLY-STONE-ENTERPRISE-CO.%2C-LTD-C1206X472K102T_C106074.html
footprint CAP-1206 (1206 (3216M) Capacitor)
pins: 1, 2

## C1206X472K201T
designator C?  Capacitance: 4.7nF  (hidden comment: *)
Capacitor, Ceramic (MLCC), 4.7nF, ±10%, 200V, X7R, ±10%, SMD 1206; Manufacturer: IHHEC(HOLY STONE ENTERPRISE CO., LTD); Manufacturer Part Number: C1206X472K201T; Package Size: 1206; JLCPCB Basic Part: No; JLCPCB Part Number: C106075; Supplier 1: LCSC; Category: Capacitors - MLCC; Supplier Part Number 1: C106075; Tolerance: ±10%; Voltage Rating: 200V; Temperature Coefficient: X7R; RoHS: Yes; ComponentLink1Description: Datasheet; ComponentLink1URL: https://wmsc.lcsc.com/wmsc/upload/file/pdf/v2/lcsc/2304140030_IHHEC-HOLY-STONE-ENTERPRISE-CO---LTD-C1206X472K201T_C106075.pdf; ComponentLink2Description: JLCPCB Part URL; ComponentLink2URL: https://jlcpcb.com/partdetail/C106075; ComponentLink3Description: LCSC Part URL; ComponentLink3URL: https://lcsc.com/product-detail/Multilayer-Ceramic-Capacitors-MLCC---SMD-SMT_IHHECHOLY-STONE-ENTERPRISE-CO.%2C-LTD-IHHECHOLY-STONE-ENTERPRISE-CO.%2C-LTD-C1206X472K201T_C106075.html
footprint CAP-1206 (1206 (3216M) Capacitor)
pins: 1, 2

## C1206X472K202T
designator C?  Capacitance: 4.7nF  (hidden comment: *)
Capacitor, Ceramic (MLCC), 4.7nF, ±10%, 2kV, X7R, ±10%, SMD 1206; Manufacturer: IHHEC(HOLY STONE ENTERPRISE CO., LTD); Manufacturer Part Number: C1206X472K202T; Package Size: 1206; JLCPCB Basic Part: No; JLCPCB Part Number: C106076; Supplier 1: LCSC; Category: Capacitors - MLCC; Supplier Part Number 1: C106076; Tolerance: ±10%; Voltage Rating: 2kV; Temperature Coefficient: X7R; RoHS: Yes; ComponentLink1Description: Datasheet; ComponentLink1URL: https://wmsc.lcsc.com/wmsc/upload/file/pdf/v2/lcsc/2304140030_IHHEC-HOLY-STONE-ENTERPRISE-CO---LTD-C1206X472K202T_C106076.pdf; ComponentLink2Description: JLCPCB Part URL; ComponentLink2URL: https://jlcpcb.com/partdetail/C106076; ComponentLink3Description: LCSC Part URL; ComponentLink3URL: https://lcsc.com/product-detail/Multilayer-Ceramic-Capacitors-MLCC---SMD-SMT_IHHECHOLY-STONE-ENTERPRISE-CO.%2C-LTD-IHHECHOLY-STONE-ENTERPRISE-CO.%2C-LTD-C1206X472K202T_C106076.html
footprint CAP-1206 (1206 (3216M) Capacitor)
pins: 1, 2

## C1206X472K251T
designator C?  Capacitance: 4.7nF  (hidden comment: *)
Capacitor, Ceramic (MLCC), 4.7nF, ±10%, 250V, X7R, ±10%, SMD 1206; Manufacturer: IHHEC(HOLY STONE ENTERPRISE CO., LTD); Manufacturer Part Number: C1206X472K251T; Package Size: 1206; JLCPCB Basic Part: No; JLCPCB Part Number: C106077; Supplier 1: LCSC; Category: Capacitors - MLCC; Supplier Part Number 1: C106077; Tolerance: ±10%; Voltage Rating: 250V; Temperature Coefficient: X7R; RoHS: Yes; ComponentLink1Description: Datasheet; ComponentLink1URL: https://wmsc.lcsc.com/wmsc/upload/file/pdf/v2/lcsc/2304140030_IHHEC-HOLY-STONE-ENTERPRISE-CO---LTD-C1206X472K251T_C106077.pdf; ComponentLink2Description: JLCPCB Part URL; ComponentLink2URL: https://jlcpcb.com/partdetail/C106077; ComponentLink3Description: LCSC Part URL; ComponentLink3URL: https://lcsc.com/product-detail/Multilayer-Ceramic-Capacitors-MLCC---SMD-SMT_IHHECHOLY-STONE-ENTERPRISE-CO.%2C-LTD-IHHECHOLY-STONE-ENTERPRISE-CO.%2C-LTD-C1206X472K251T_C106077.html
footprint CAP-1206 (1206 (3216M) Capacitor)
pins: 1, 2

## C1206X472K501T
designator C?  Capacitance: 4.7nF  (hidden comment: *)
Capacitor, Ceramic (MLCC), 4.7nF, ±10%, 500V, X7R, ±10%, SMD 1206; Manufacturer: IHHEC(HOLY STONE ENTERPRISE CO., LTD); Manufacturer Part Number: C1206X472K501T; Package Size: 1206; JLCPCB Basic Part: No; JLCPCB Part Number: C106078; Supplier 1: LCSC; Category: Capacitors - MLCC; Supplier Part Number 1: C106078; Tolerance: ±10%; Voltage Rating: 500V; Temperature Coefficient: X7R; RoHS: Yes; ComponentLink1Description: Datasheet; ComponentLink1URL: https://wmsc.lcsc.com/wmsc/upload/file/pdf/v2/lcsc/2304140030_IHHEC-HOLY-STONE-ENTERPRISE-CO---LTD-C1206X472K501T_C106078.pdf; ComponentLink2Description: JLCPCB Part URL; ComponentLink2URL: https://jlcpcb.com/partdetail/C106078; ComponentLink3Description: LCSC Part URL; ComponentLink3URL: https://lcsc.com/product-detail/Multilayer-Ceramic-Capacitors-MLCC---SMD-SMT_IHHECHOLY-STONE-ENTERPRISE-CO.%2C-LTD-IHHECHOLY-STONE-ENTERPRISE-CO.%2C-LTD-C1206X472K501T_C106078.html
footprint CAP-1206 (1206 (3216M) Capacitor)
pins: 1, 2

## C1206X472M251T
designator C?  Capacitance: 4.7nF  (hidden comment: *)
Capacitor, Ceramic (MLCC), 4.7nF, ±20%, 250V, X7R, ±20%, SMD 1206; Manufacturer: IHHEC(HOLY STONE ENTERPRISE CO., LTD); Manufacturer Part Number: C1206X472M251T; Package Size: 1206; JLCPCB Basic Part: No; JLCPCB Part Number: C106079; Supplier 1: LCSC; Category: Capacitors - MLCC; Supplier Part Number 1: C106079; Tolerance: ±20%; Voltage Rating: 250V; Temperature Coefficient: X7R; RoHS: Yes; ComponentLink1Description: Datasheet; ComponentLink1URL: https://wmsc.lcsc.com/wmsc/upload/file/pdf/v2/lcsc/2304140030_IHHEC-HOLY-STONE-ENTERPRISE-CO---LTD-C1206X472M251T_C106079.pdf; ComponentLink2Description: JLCPCB Part URL; ComponentLink2URL: https://jlcpcb.com/partdetail/C106079; ComponentLink3Description: LCSC Part URL; ComponentLink3URL: https://lcsc.com/product-detail/Multilayer-Ceramic-Capacitors-MLCC---SMD-SMT_IHHECHOLY-STONE-ENTERPRISE-CO.%2C-LTD-IHHECHOLY-STONE-ENTERPRISE-CO.%2C-LTD-C1206X472M251T_C106079.html
footprint CAP-1206 (1206 (3216M) Capacitor)
pins: 1, 2

## C1206X473K101T
designator C?  Capacitance: 47nF  (hidden comment: *)
Capacitor, Ceramic (MLCC), 47nF, ±10%, 100V, X7R, ±10%, SMD 1206; Manufacturer: IHHEC(HOLY STONE ENTERPRISE CO., LTD); Manufacturer Part Number: C1206X473K101T; Package Size: 1206; JLCPCB Basic Part: No; JLCPCB Part Number: C106080; Supplier 1: LCSC; Category: Capacitors - MLCC; Supplier Part Number 1: C106080; Tolerance: ±10%; Voltage Rating: 100V; Temperature Coefficient: X7R; RoHS: Yes; ComponentLink1Description: Datasheet; ComponentLink1URL: https://wmsc.lcsc.com/wmsc/upload/file/pdf/v2/lcsc/2304140030_IHHEC-HOLY-STONE-ENTERPRISE-CO---LTD-C1206X473K101T_C106080.pdf; ComponentLink2Description: JLCPCB Part URL; ComponentLink2URL: https://jlcpcb.com/partdetail/C106080; ComponentLink3Description: LCSC Part URL; ComponentLink3URL: https://lcsc.com/product-detail/Multilayer-Ceramic-Capacitors-MLCC---SMD-SMT_IHHECHOLY-STONE-ENTERPRISE-CO.%2C-LTD-IHHECHOLY-STONE-ENTERPRISE-CO.%2C-LTD-C1206X473K101T_C106080.html
footprint CAP-1206 (1206 (3216M) Capacitor)
pins: 1, 2

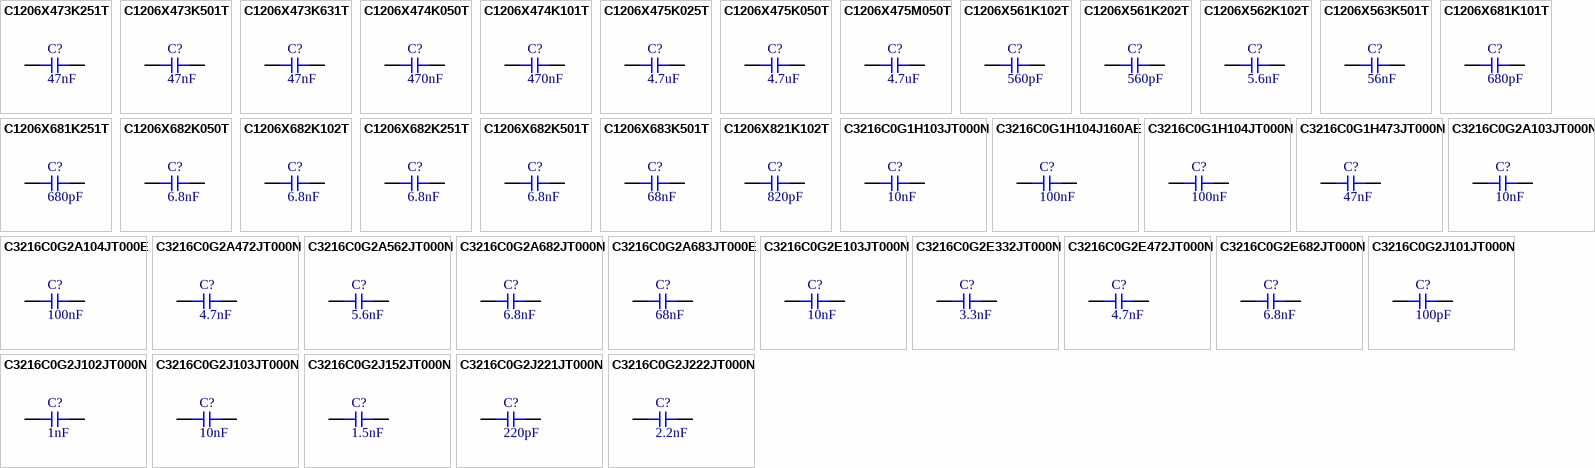
[diagram p20: symbols C1206X473K251T to C3216C0G2J222JT000N]

## C1206X473K251T
designator C?  Capacitance: 47nF  (hidden comment: *)
Capacitor, Ceramic (MLCC), 47nF, ±10%, 250V, X7R, ±10%, SMD 1206; Manufacturer: IHHEC(HOLY STONE ENTERPRISE CO., LTD); Manufacturer Part Number: C1206X473K251T; Package Size: 1206; JLCPCB Basic Part: No; JLCPCB Part Number: C106081; Supplier 1: LCSC; Category: Capacitors - MLCC; Supplier Part Number 1: C106081; Tolerance: ±10%; Voltage Rating: 250V; Temperature Coefficient: X7R; RoHS: Yes; ComponentLink1Description: Datasheet; ComponentLink1URL: https://wmsc.lcsc.com/wmsc/upload/file/pdf/v2/lcsc/2304140030_IHHEC-HOLY-STONE-ENTERPRISE-CO---LTD-C1206X473K251T_C106081.pdf; ComponentLink2Description: JLCPCB Part URL; ComponentLink2URL: https://jlcpcb.com/partdetail/C106081; ComponentLink3Description: LCSC Part URL; ComponentLink3URL: https://lcsc.com/product-detail/Multilayer-Ceramic-Capacitors-MLCC---SMD-SMT_IHHECHOLY-STONE-ENTERPRISE-CO.%2C-LTD-IHHECHOLY-STONE-ENTERPRISE-CO.%2C-LTD-C1206X473K251T_C106081.html
footprint CAP-1206 (1206 (3216M) Capacitor)
pins: 1, 2

## C1206X473K501T
designator C?  Capacitance: 47nF  (hidden comment: *)
Capacitor, Ceramic (MLCC), 47nF, ±10%, 500V, X7R, ±10%, SMD 1206; Manufacturer: IHHEC(HOLY STONE ENTERPRISE CO., LTD); Manufacturer Part Number: C1206X473K501T; Package Size: 1206; JLCPCB Basic Part: No; JLCPCB Part Number: C106082; Supplier 1: LCSC; Category: Capacitors - MLCC; Supplier Part Number 1: C106082; Tolerance: ±10%; Voltage Rating: 500V; Temperature Coefficient: X7R; RoHS: Yes; ComponentLink1Description: Datasheet; ComponentLink1URL: https://wmsc.lcsc.com/wmsc/upload/file/pdf/v2/lcsc/2304140030_IHHEC-HOLY-STONE-ENTERPRISE-CO---LTD-C1206X473K501T_C106082.pdf; ComponentLink2Description: JLCPCB Part URL; ComponentLink2URL: https://jlcpcb.com/partdetail/C106082; ComponentLink3Description: LCSC Part URL; ComponentLink3URL: https://lcsc.com/product-detail/Multilayer-Ceramic-Capacitors-MLCC---SMD-SMT_IHHECHOLY-STONE-ENTERPRISE-CO.%2C-LTD-IHHECHOLY-STONE-ENTERPRISE-CO.%2C-LTD-C1206X473K501T_C106082.html
footprint CAP-1206 (1206 (3216M) Capacitor)
pins: 1, 2

## C1206X473K631T
designator C?  Capacitance: 47nF  (hidden comment: *)
Capacitor, Ceramic (MLCC), 47nF, ±10%, 630V, X7R, ±10%, SMD 1206; Manufacturer: IHHEC(HOLY STONE ENTERPRISE CO., LTD); Manufacturer Part Number: C1206X473K631T; Package Size: 1206; JLCPCB Basic Part: No; JLCPCB Part Number: C106083; Supplier 1: LCSC; Category: Capacitors - MLCC; Supplier Part Number 1: C106083; Tolerance: ±10%; Voltage Rating: 630V; Temperature Coefficient: X7R; RoHS: Yes; ComponentLink1Description: Datasheet; ComponentLink1URL: https://wmsc.lcsc.com/wmsc/upload/file/pdf/v2/lcsc/2304140030_IHHEC-HOLY-STONE-ENTERPRISE-CO---LTD-C1206X473K631T_C106083.pdf; ComponentLink2Description: JLCPCB Part URL; ComponentLink2URL: https://jlcpcb.com/partdetail/C106083; ComponentLink3Description: LCSC Part URL; ComponentLink3URL: https://lcsc.com/product-detail/Multilayer-Ceramic-Capacitors-MLCC---SMD-SMT_IHHECHOLY-STONE-ENTERPRISE-CO.%2C-LTD-IHHECHOLY-STONE-ENTERPRISE-CO.%2C-LTD-C1206X473K631T_C106083.html
footprint CAP-1206 (1206 (3216M) Capacitor)
pins: 1, 2

## C1206X474K050T
designator C?  Capacitance: 470nF  (hidden comment: *)
Capacitor, Ceramic (MLCC), 470nF, ±10%, 50V, ±10%, SMD 1206; Manufacturer: IHHEC(HOLY STONE ENTERPRISE CO., LTD); Manufacturer Part Number: C1206X474K050T; Package Size: 1206; JLCPCB Basic Part: No; JLCPCB Part Number: C518885; Supplier 1: LCSC; Category: Capacitors - MLCC; Supplier Part Number 1: C518885; Tolerance: ±10%; Voltage Rating: 50V; RoHS: Yes; ComponentLink1Description: Datasheet; ComponentLink2Description: JLCPCB Part URL; ComponentLink2URL: https://jlcpcb.com/partdetail/C518885; ComponentLink3Description: LCSC Part URL; ComponentLink3URL: https://lcsc.com/product-detail/Multilayer-Ceramic-Capacitors-MLCC---SMD-SMT_IHHECHOLY-STONE-ENTERPRISE-CO.%2C-LTD-IHHECHOLY-STONE-ENTERPRISE-CO.%2C-LTD-C1206X474K050T_C518885.html
footprint CAP-1206 (1206 (3216M) Capacitor)
pins: 1, 2

## C1206X474K101T
designator C?  Capacitance: 470nF  (hidden comment: *)
Capacitor, Ceramic (MLCC), 470nF, ±10%, 100V, X7R, ±10%, SMD 1206; Manufacturer: IHHEC(HOLY STONE ENTERPRISE CO., LTD); Manufacturer Part Number: C1206X474K101T; Package Size: 1206; JLCPCB Basic Part: No; JLCPCB Part Number: C106084; Supplier 1: LCSC; Category: Capacitors - MLCC; Supplier Part Number 1: C106084; Tolerance: ±10%; Voltage Rating: 100V; Temperature Coefficient: X7R; RoHS: Yes; ComponentLink1Description: Datasheet; ComponentLink1URL: https://wmsc.lcsc.com/wmsc/upload/file/pdf/v2/lcsc/2304140030_IHHEC-HOLY-STONE-ENTERPRISE-CO---LTD-C1206X474K101T_C106084.pdf; ComponentLink2Description: JLCPCB Part URL; ComponentLink2URL: https://jlcpcb.com/partdetail/C106084; ComponentLink3Description: LCSC Part URL; ComponentLink3URL: https://lcsc.com/product-detail/Multilayer-Ceramic-Capacitors-MLCC---SMD-SMT_IHHECHOLY-STONE-ENTERPRISE-CO.%2C-LTD-IHHECHOLY-STONE-ENTERPRISE-CO.%2C-LTD-C1206X474K101T_C106084.html
footprint CAP-1206 (1206 (3216M) Capacitor)
pins: 1, 2
